# Altium schematic symbol library jlcpcb_2025_04_capacitors_extended_0402.schlib: 3594 symbols (part 4 of 20) (continued)
## 0402X474K100CT
designator C?  Capacitance: 470nF  (hidden comment: *)
Capacitor, Ceramic (MLCC), 470nF, ±10%, 10V, X5R, ±10%, SMD 0402; Manufacturer: Walsin Tech Corp; Manufacturer Part Number: 0402X474K100CT; Package Size: 0402; JLCPCB Basic Part: No; JLCPCB Part Number: C295946; Supplier 1: LCSC; Category: Capacitors - MLCC; Supplier Part Number 1: C295946; Tolerance: ±10%; Voltage Rating: 10V; Temperature Coefficient: X5R; RoHS: Yes; ComponentLink1Description: Datasheet; ComponentLink1URL: https://wmsc.lcsc.com/wmsc/upload/file/pdf/v2/lcsc/2304140030_Walsin-Tech-Corp-0402X474K100CT_C295946.pdf; ComponentLink2Description: JLCPCB Part URL; ComponentLink2URL: https://jlcpcb.com/partdetail/C295946; ComponentLink3Description: LCSC Part URL; ComponentLink3URL: https://lcsc.com/product-detail/Multilayer-Ceramic-Capacitors-MLCC---SMD-SMT_Walsin-Tech-Corp-Walsin-Tech-Corp-0402X474K100CT_C295946.html
footprint CAP-0402 (0402 (1005M) Capacitor)
pins: 1, 2

## 0402X474K100NT
designator C?  Capacitance: 470000pF  (hidden comment: *)
Capacitor, Ceramic (MLCC), 470000pF, ±10%, 10V, X5R, ±10%, SMD 0402; Manufacturer: FH (Guangdong Fenghua Advanced Tech); Manufacturer Part Number: 0402X474K100NT; Package Size: 0402; JLCPCB Basic Part: No; JLCPCB Part Number: C967572; Supplier 1: LCSC; Category: Capacitors - MLCC; Supplier Part Number 1: C967572; Tolerance: ±10%; Voltage Rating: 10V; Temperature Coefficient: X5R; RoHS: Yes; ComponentLink1Description: Datasheet; ComponentLink1URL: https://wmsc.lcsc.com/wmsc/upload/file/pdf/v2/lcsc/2304140030_FH--Guangdong-Fenghua-Advanced-Tech-0402X474K100NT_C967572.pdf; ComponentLink2Description: JLCPCB Part URL; ComponentLink2URL: https://jlcpcb.com/partdetail/C967572; ComponentLink3Description: LCSC Part URL; ComponentLink3URL: https://lcsc.com/product-detail/Multilayer-Ceramic-Capacitors-MLCC---SMD-SMT_FH-Guangdong-Fenghua-Advanced-Tech-FH-Guangdong-Fenghua-Advanced-Tech-0402X474K100NT_C967572.html
footprint CAP-0402 (0402 (1005M) Capacitor)
pins: 1, 2

## 0402X474K160CT
designator C?  Capacitance: 470nF  (hidden comment: *)
Capacitor, Ceramic (MLCC), 470nF, ±10%, 16V, X5R, ±10%, SMD 0402; Manufacturer: Walsin Tech Corp; Manufacturer Part Number: 0402X474K160CT; Package Size: 0402; JLCPCB Basic Part: No; JLCPCB Part Number: C575468; Supplier 1: LCSC; Category: Capacitors - MLCC; Supplier Part Number 1: C575468; Tolerance: ±10%; Voltage Rating: 16V; Temperature Coefficient: X5R; RoHS: Yes; ComponentLink1Description: Datasheet; ComponentLink1URL: https://wmsc.lcsc.com/wmsc/upload/file/pdf/v2/lcsc/2304140030_Walsin-Tech-Corp-0402X474K160CT_C575468.pdf; ComponentLink2Description: JLCPCB Part URL; ComponentLink2URL: https://jlcpcb.com/partdetail/C575468; ComponentLink3Description: LCSC Part URL; ComponentLink3URL: https://lcsc.com/product-detail/Multilayer-Ceramic-Capacitors-MLCC---SMD-SMT_Walsin-Tech-Corp-Walsin-Tech-Corp-0402X474K160CT_C575468.html
footprint CAP-0402 (0402 (1005M) Capacitor)
pins: 1, 2

## 0402X474K250CT
designator C?  Capacitance: 470nF  (hidden comment: *)
Capacitor, Ceramic (MLCC), 470nF, ±10%, 25V, X5R, ±10%, SMD 0402; Manufacturer: Walsin Tech Corp; Manufacturer Part Number: 0402X474K250CT; Package Size: 0402; JLCPCB Basic Part: No; JLCPCB Part Number: C387962; Supplier 1: LCSC; Category: Capacitors - MLCC; Supplier Part Number 1: C387962; Tolerance: ±10%; Voltage Rating: 25V; Temperature Coefficient: X5R; RoHS: Yes; ComponentLink1Description: Datasheet; ComponentLink1URL: https://wmsc.lcsc.com/wmsc/upload/file/pdf/v2/lcsc/2304140030_Walsin-Tech-Corp-0402X474K250CT_C387962.pdf; ComponentLink2Description: JLCPCB Part URL; ComponentLink2URL: https://jlcpcb.com/partdetail/C387962; ComponentLink3Description: LCSC Part URL; ComponentLink3URL: https://lcsc.com/product-detail/Multilayer-Ceramic-Capacitors-MLCC---SMD-SMT_Walsin-Tech-Corp-Walsin-Tech-Corp-0402X474K250CT_C387962.html
footprint CAP-0402 (0402 (1005M) Capacitor)
pins: 1, 2

## 0402X474K250NT
designator C?  Capacitance: 470nF  (hidden comment: *)
Capacitor, Ceramic (MLCC), 470nF, ±10%, 25V, X5R, ±10%, SMD 0402; Manufacturer: FH (Guangdong Fenghua Advanced Tech); Manufacturer Part Number: 0402X474K250NT; Package Size: 0402; JLCPCB Basic Part: No; JLCPCB Part Number: C2934765; Supplier 1: LCSC; Category: Capacitors - MLCC; Supplier Part Number 1: C2934765; Tolerance: ±10%; Voltage Rating: 25V; Temperature Coefficient: X5R; RoHS: Yes; ComponentLink1Description: Datasheet; ComponentLink1URL: https://wmsc.lcsc.com/wmsc/upload/file/pdf/v2/lcsc/2201121630_FH--Guangdong-Fenghua-Advanced-Tech-0402X474K250NT_C2934765.pdf; ComponentLink2Description: JLCPCB Part URL; ComponentLink2URL: https://jlcpcb.com/partdetail/C2934765; ComponentLink3Description: LCSC Part URL; ComponentLink3URL: https://lcsc.com/product-detail/Multilayer-Ceramic-Capacitors-MLCC---SMD-SMT_FH-Guangdong-Fenghua-Advanced-Tech-FH-Guangdong-Fenghua-Advanced-Tech-0402X474K250NT_C2934765.html
footprint CAP-0402 (0402 (1005M) Capacitor)
pins: 1, 2

## 0402X474K500CT
designator C?  Capacitance: 470nF  (hidden comment: *)
Capacitor, Ceramic (MLCC), 470nF, ±10%, 50V, X5R, ±10%, SMD 0402; Manufacturer: Walsin Tech Corp; Manufacturer Part Number: 0402X474K500CT; Package Size: 0402; JLCPCB Basic Part: No; JLCPCB Part Number: C2443204; Supplier 1: LCSC; Category: Capacitors - MLCC; Supplier Part Number 1: C2443204; Tolerance: ±10%; Voltage Rating: 50V; Temperature Coefficient: X5R; RoHS: Yes; ComponentLink1Description: Datasheet; ComponentLink1URL: https://wmsc.lcsc.com/wmsc/upload/file/pdf/v2/lcsc/2309201534_Walsin-Tech-Corp-0402X474K500CT_C2443204.pdf; ComponentLink2Description: JLCPCB Part URL; ComponentLink2URL: https://jlcpcb.com/partdetail/C2443204; ComponentLink3Description: LCSC Part URL; ComponentLink3URL: https://lcsc.com/product-detail/Multilayer-Ceramic-Capacitors-MLCC---SMD-SMT_Walsin-Tech-Corp-Walsin-Tech-Corp-0402X474K500CT_C2443204.html
footprint CAP-0402 (0402 (1005M) Capacitor)
pins: 1, 2

## 0402X475K6R3NT
designator C?  Capacitance: 4.7uF  (hidden comment: *)
Capacitor, Ceramic (MLCC), 4.7uF, ±10%, 6.3V, X5R, ±10%, SMD 0402; Manufacturer: FH(Guangdong Fenghua Advanced Tech); Manufacturer Part Number: 0402X475K6R3NT; Package Size: 0402; JLCPCB Basic Part: No; JLCPCB Part Number: C157354; Supplier 1: LCSC; Category: Capacitors - MLCC; Supplier Part Number 1: C157354; Tolerance: ±10%; Voltage Rating: 6.3V; Temperature Coefficient: X5R; RoHS: Yes; ComponentLink1Description: Datasheet; ComponentLink1URL: https://wmsc.lcsc.com/wmsc/upload/file/pdf/v2/lcsc/2304140030_FH--Guangdong-Fenghua-Advanced-Tech-0402X475K6R3NT_C157354.pdf; ComponentLink2Description: JLCPCB Part URL; ComponentLink2URL: https://jlcpcb.com/partdetail/C157354; ComponentLink3Description: LCSC Part URL; ComponentLink3URL: https://lcsc.com/product-detail/Multilayer-Ceramic-Capacitors-MLCC---SMD-SMT_FH-Guangdong-Fenghua-Advanced-Tech-FH-Guangdong-Fenghua-Advanced-Tech-0402X475K6R3NT_C157354.html
footprint CAP-0402 (0402 (1005M) Capacitor)
pins: 1, 2

## 0402X475K100NT
designator C?  Capacitance: 4.7uF  (hidden comment: *)
Capacitor, Ceramic (MLCC), 4.7uF, ±10%, 10V, X5R, ±10%, SMD 0402; Manufacturer: FH(Guangdong Fenghua Advanced Tech); Manufacturer Part Number: 0402X475K100NT; Package Size: 0402; JLCPCB Basic Part: No; JLCPCB Part Number: C191541; Supplier 1: LCSC; Category: Capacitors - MLCC; Supplier Part Number 1: C191541; Tolerance: ±10%; Voltage Rating: 10V; Temperature Coefficient: X5R; RoHS: Yes; ComponentLink1Description: Datasheet; ComponentLink1URL: https://wmsc.lcsc.com/wmsc/upload/file/pdf/v2/lcsc/2310131130_FH--Guangdong-Fenghua-Advanced-Tech-0402X475K100NT_C191541.pdf; ComponentLink2Description: JLCPCB Part URL; ComponentLink2URL: https://jlcpcb.com/partdetail/C191541; ComponentLink3Description: LCSC Part URL; ComponentLink3URL: https://lcsc.com/product-detail/Multilayer-Ceramic-Capacitors-MLCC---SMD-SMT_FH-Guangdong-Fenghua-Advanced-Tech-FH-Guangdong-Fenghua-Advanced-Tech-0402X475K100NT_C191541.html
footprint CAP-0402 (0402 (1005M) Capacitor)
pins: 1, 2

## 0402X475M6R3CT
designator C?  Capacitance: 4.7uF  (hidden comment: *)
Capacitor, Ceramic (MLCC), 4.7uF, ±20%, 6.3V, X5R, ±20%, SMD 0402; Manufacturer: Walsin Tech Corp; Manufacturer Part Number: 0402X475M6R3CT; Package Size: 0402; JLCPCB Basic Part: No; JLCPCB Part Number: C340648; Supplier 1: LCSC; Category: Capacitors - MLCC; Supplier Part Number 1: C340648; Tolerance: ±20%; Voltage Rating: 6.3V; Temperature Coefficient: X5R; RoHS: Yes; ComponentLink1Description: Datasheet; ComponentLink1URL: https://wmsc.lcsc.com/wmsc/upload/file/pdf/v2/lcsc/2304140030_Walsin-Tech-Corp-0402X475M6R3CT_C340648.pdf; ComponentLink2Description: JLCPCB Part URL; ComponentLink2URL: https://jlcpcb.com/partdetail/C340648; ComponentLink3Description: LCSC Part URL; ComponentLink3URL: https://lcsc.com/product-detail/Multilayer-Ceramic-Capacitors-MLCC---SMD-SMT_Walsin-Tech-Corp-Walsin-Tech-Corp-0402X475M6R3CT_C340648.html
footprint CAP-0402 (0402 (1005M) Capacitor)
pins: 1, 2

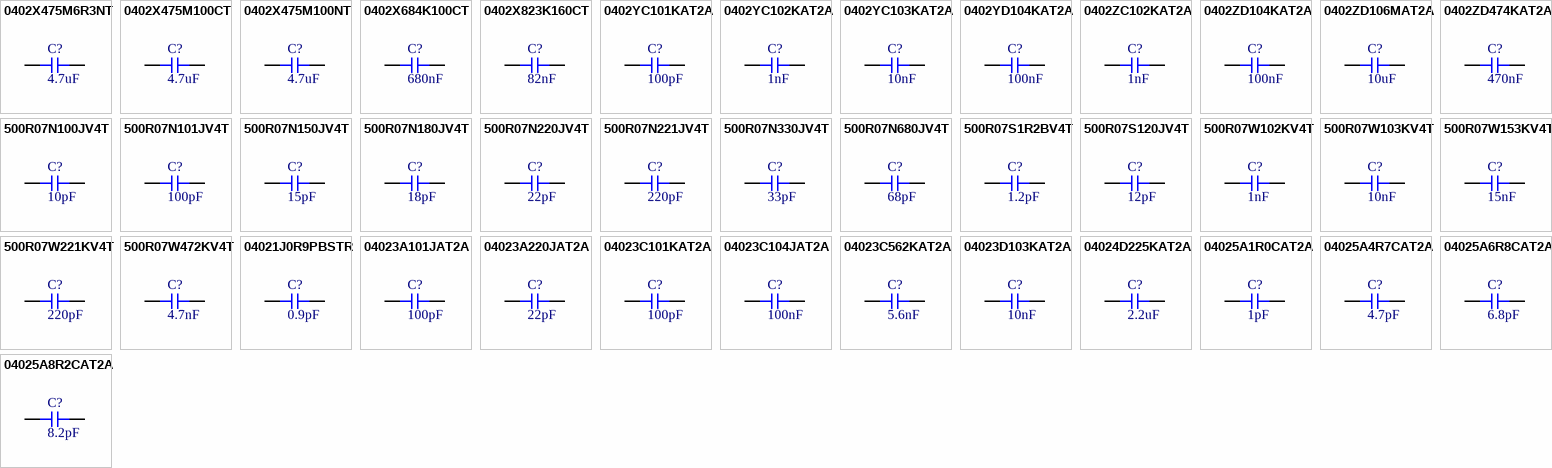
[diagram p15: symbols 0402X475M6R3NT to 04025A8R2CAT2A]

## 0402X475M6R3NT
designator C?  Capacitance: 4.7uF  (hidden comment: *)
Capacitor, Ceramic (MLCC), 4.7uF, ±20%, 6.3V, X5R, ±20%, SMD 0402; Manufacturer: FH(Guangdong Fenghua Advanced Tech); Manufacturer Part Number: 0402X475M6R3NT; Package Size: 0402; JLCPCB Basic Part: No; JLCPCB Part Number: C168172; Supplier 1: LCSC; Category: Capacitors - MLCC; Supplier Part Number 1: C168172; Tolerance: ±20%; Voltage Rating: 6.3V; Temperature Coefficient: X5R; RoHS: Yes; ComponentLink1Description: Datasheet; ComponentLink1URL: https://wmsc.lcsc.com/wmsc/upload/file/pdf/v2/lcsc/2304140030_FH--Guangdong-Fenghua-Advanced-Tech-0402X475M6R3NT_C168172.pdf; ComponentLink2Description: JLCPCB Part URL; ComponentLink2URL: https://jlcpcb.com/partdetail/C168172; ComponentLink3Description: LCSC Part URL; ComponentLink3URL: https://lcsc.com/product-detail/Multilayer-Ceramic-Capacitors-MLCC---SMD-SMT_FH-Guangdong-Fenghua-Advanced-Tech-FH-Guangdong-Fenghua-Advanced-Tech-0402X475M6R3NT_C168172.html
footprint CAP-0402 (0402 (1005M) Capacitor)
pins: 1, 2

## 0402X475M100CT
designator C?  Capacitance: 4.7uF  (hidden comment: *)
Capacitor, Ceramic (MLCC), 4.7uF, 10V, X5R, SMD 0402; Manufacturer: Walsin Tech Corp; Manufacturer Part Number: 0402X475M100CT; Package Size: 0402; JLCPCB Basic Part: No; JLCPCB Part Number: C2909465; Supplier 1: LCSC; Category: Capacitors - MLCC; Supplier Part Number 1: C2909465; Voltage Rating: 10V; Temperature Coefficient: X5R; RoHS: Yes; ComponentLink1Description: Datasheet; ComponentLink1URL: https://wmsc.lcsc.com/wmsc/upload/file/pdf/v2/lcsc/2110272130_Walsin-Tech-Corp-0402X475M100CT_C2909465.pdf; ComponentLink2Description: JLCPCB Part URL; ComponentLink2URL: https://jlcpcb.com/partdetail/C2909465; ComponentLink3Description: LCSC Part URL; ComponentLink3URL: https://lcsc.com/product-detail/Multilayer-Ceramic-Capacitors-MLCC---SMD-SMT_Walsin-Tech-Corp-Walsin-Tech-Corp-0402X475M100CT_C2909465.html
footprint CAP-0402 (0402 (1005M) Capacitor)
pins: 1, 2

## 0402X475M100NT
designator C?  Capacitance: 4.7uF  (hidden comment: *)
Capacitor, Ceramic (MLCC), 4.7uF, ±20%, 10V, X5R, ±20%, SMD 0402; Manufacturer: FH(Guangdong Fenghua Advanced Tech); Manufacturer Part Number: 0402X475M100NT; Package Size: 0402; JLCPCB Basic Part: No; JLCPCB Part Number: C167656; Supplier 1: LCSC; Category: Capacitors - MLCC; Supplier Part Number 1: C167656; Tolerance: ±20%; Voltage Rating: 10V; Temperature Coefficient: X5R; RoHS: Yes; ComponentLink1Description: Datasheet; ComponentLink1URL: https://wmsc.lcsc.com/wmsc/upload/file/pdf/v2/lcsc/2304140030_FH--Guangdong-Fenghua-Advanced-Tech-0402X475M100NT_C167656.pdf; ComponentLink2Description: JLCPCB Part URL; ComponentLink2URL: https://jlcpcb.com/partdetail/C167656; ComponentLink3Description: LCSC Part URL; ComponentLink3URL: https://lcsc.com/product-detail/Multilayer-Ceramic-Capacitors-MLCC---SMD-SMT_FH-Guangdong-Fenghua-Advanced-Tech-FH-Guangdong-Fenghua-Advanced-Tech-0402X475M100NT_C167656.html
footprint CAP-0402 (0402 (1005M) Capacitor)
pins: 1, 2

## 0402X684K100CT
designator C?  Capacitance: 680nF  (hidden comment: *)
Capacitor, Ceramic (MLCC), 680nF, ±10%, 10V, X5R, ±10%, SMD 0402; Manufacturer: Walsin Tech Corp; Manufacturer Part Number: 0402X684K100CT; Package Size: 0402; JLCPCB Basic Part: No; JLCPCB Part Number: C295947; Supplier 1: LCSC; Category: Capacitors - MLCC; Supplier Part Number 1: C295947; Tolerance: ±10%; Voltage Rating: 10V; Temperature Coefficient: X5R; RoHS: Yes; ComponentLink1Description: Datasheet; ComponentLink1URL: https://wmsc.lcsc.com/wmsc/upload/file/pdf/v2/lcsc/2304140030_Walsin-Tech-Corp-0402X684K100CT_C295947.pdf; ComponentLink2Description: JLCPCB Part URL; ComponentLink2URL: https://jlcpcb.com/partdetail/C295947; ComponentLink3Description: LCSC Part URL; ComponentLink3URL: https://lcsc.com/product-detail/Multilayer-Ceramic-Capacitors-MLCC---SMD-SMT_Walsin-Tech-Corp-Walsin-Tech-Corp-0402X684K100CT_C295947.html
footprint CAP-0402 (0402 (1005M) Capacitor)
pins: 1, 2

## 0402X823K160CT
designator C?  Capacitance: 82nF  (hidden comment: *)
Capacitor, Ceramic (MLCC), 82nF, ±10%, 16V, X5R, ±10%, SMD 0402; Manufacturer: Walsin Tech Corp; Manufacturer Part Number: 0402X823K160CT; Package Size: 0402; JLCPCB Basic Part: No; JLCPCB Part Number: C458873; Supplier 1: LCSC; Category: Capacitors - MLCC; Supplier Part Number 1: C458873; Tolerance: ±10%; Voltage Rating: 16V; Temperature Coefficient: X5R; RoHS: Yes; ComponentLink1Description: Datasheet; ComponentLink1URL: https://wmsc.lcsc.com/wmsc/upload/file/pdf/v2/lcsc/2304140030_Walsin-Tech-Corp-0402X823K160CT_C458873.pdf; ComponentLink2Description: JLCPCB Part URL; ComponentLink2URL: https://jlcpcb.com/partdetail/C458873; ComponentLink3Description: LCSC Part URL; ComponentLink3URL: https://lcsc.com/product-detail/Multilayer-Ceramic-Capacitors-MLCC---SMD-SMT_Walsin-Tech-Corp-Walsin-Tech-Corp-0402X823K160CT_C458873.html
footprint CAP-0402 (0402 (1005M) Capacitor)
pins: 1, 2

## 0402YC101KAT2A
designator C?  Capacitance: 100pF  (hidden comment: *)
Capacitor, Ceramic (MLCC), 100pF, ±10%, 16V, X7R, ±10%, SMD 0402; Manufacturer: AVX; Manufacturer Part Number: 0402YC101KAT2A; Package Size: 0402; JLCPCB Basic Part: No; JLCPCB Part Number: C597051; Supplier 1: LCSC; Category: Capacitors - MLCC; Supplier Part Number 1: C597051; Tolerance: ±10%; Voltage Rating: 16V; Temperature Coefficient: X7R; RoHS: Yes; ComponentLink1Description: Datasheet; ComponentLink1URL: https://wmsc.lcsc.com/wmsc/upload/file/pdf/v2/lcsc/2304140030_Kyocera-AVX-0402YC101KAT2A_C597051.pdf; ComponentLink2Description: JLCPCB Part URL; ComponentLink2URL: https://jlcpcb.com/partdetail/C597051; ComponentLink3Description: LCSC Part URL; ComponentLink3URL: https://lcsc.com/product-detail/Multilayer-Ceramic-Capacitors-MLCC---SMD-SMT_Kyocera-AVX-Kyocera-AVX-0402YC101KAT2A_C597051.html
footprint CAP-0402 (0402 (1005M) Capacitor)
pins: 1, 2

## 0402YC102KAT2A
designator C?  Capacitance: 1nF  (hidden comment: *)
Capacitor, Ceramic (MLCC), 1nF, ±10%, 16V, X7R, ±10%, SMD 0402; Manufacturer: AVX; Manufacturer Part Number: 0402YC102KAT2A; Package Size: 0402; JLCPCB Basic Part: No; JLCPCB Part Number: C597052; Supplier 1: LCSC; Category: Capacitors - MLCC; Supplier Part Number 1: C597052; Tolerance: ±10%; Voltage Rating: 16V; Temperature Coefficient: X7R; RoHS: Yes; ComponentLink1Description: Datasheet; ComponentLink1URL: https://wmsc.lcsc.com/wmsc/upload/file/pdf/v2/lcsc/2304140030_Kyocera-AVX-0402YC102KAT2A_C597052.pdf; ComponentLink2Description: JLCPCB Part URL; ComponentLink2URL: https://jlcpcb.com/partdetail/C597052; ComponentLink3Description: LCSC Part URL; ComponentLink3URL: https://lcsc.com/product-detail/Multilayer-Ceramic-Capacitors-MLCC---SMD-SMT_Kyocera-AVX-Kyocera-AVX-0402YC102KAT2A_C597052.html
footprint CAP-0402 (0402 (1005M) Capacitor)
pins: 1, 2

## 0402YC103KAT2A
designator C?  Capacitance: 10nF  (hidden comment: *)
Capacitor, Ceramic (MLCC), 10nF, ±10%, 16V, X7R, ±10%, SMD 0402; Manufacturer: AVX; Manufacturer Part Number: 0402YC103KAT2A; Package Size: 0402; JLCPCB Basic Part: No; JLCPCB Part Number: C597054; Supplier 1: LCSC; Category: Capacitors - MLCC; Supplier Part Number 1: C597054; Tolerance: ±10%; Voltage Rating: 16V; Temperature Coefficient: X7R; RoHS: Yes; ComponentLink1Description: Datasheet; ComponentLink1URL: https://wmsc.lcsc.com/wmsc/upload/file/pdf/v2/lcsc/2304140030_Kyocera-AVX-0402YC103KAT2A_C597054.pdf; ComponentLink2Description: JLCPCB Part URL; ComponentLink2URL: https://jlcpcb.com/partdetail/C597054; ComponentLink3Description: LCSC Part URL; ComponentLink3URL: https://lcsc.com/product-detail/Multilayer-Ceramic-Capacitors-MLCC---SMD-SMT_Kyocera-AVX-Kyocera-AVX-0402YC103KAT2A_C597054.html
footprint CAP-0402 (0402 (1005M) Capacitor)
pins: 1, 2

## 0402YD104KAT2A
designator C?  Capacitance: 100nF  (hidden comment: *)
Capacitor, Ceramic (MLCC), 100nF, ±10%, 16V, X5R, ±10%, SMD 0402; Manufacturer: AVX; Manufacturer Part Number: 0402YD104KAT2A; Package Size: 0402; JLCPCB Basic Part: No; JLCPCB Part Number: C142647; Supplier 1: LCSC; Category: Capacitors - MLCC; Supplier Part Number 1: C142647; Tolerance: ±10%; Voltage Rating: 16V; Temperature Coefficient: X5R; RoHS: Yes; ComponentLink1Description: Datasheet; ComponentLink1URL: https://wmsc.lcsc.com/wmsc/upload/file/pdf/v2/lcsc/2304140030_Kyocera-AVX-0402YD104KAT2A_C142647.pdf; ComponentLink2Description: JLCPCB Part URL; ComponentLink2URL: https://jlcpcb.com/partdetail/C142647; ComponentLink3Description: LCSC Part URL; ComponentLink3URL: https://lcsc.com/product-detail/Multilayer-Ceramic-Capacitors-MLCC---SMD-SMT_Kyocera-AVX-Kyocera-AVX-0402YD104KAT2A_C142647.html
footprint CAP-0402 (0402 (1005M) Capacitor)
pins: 1, 2

## 0402ZC102KAT2A
designator C?  Capacitance: 1nF  (hidden comment: *)
Capacitor, Ceramic (MLCC), 1nF, ±10%, 10V, X7R, ±10%, SMD 0402; Manufacturer: Kyocera AVX; Manufacturer Part Number: 0402ZC102KAT2A; Package Size: 0402; JLCPCB Basic Part: No; JLCPCB Part Number: C5348662; Supplier 1: LCSC; Category: Capacitors - MLCC; Supplier Part Number 1: C5348662; Tolerance: ±10%; Voltage Rating: 10V; Temperature Coefficient: X7R; RoHS: Yes; ComponentLink1Description: Datasheet; ComponentLink1URL: https://wmsc.lcsc.com/wmsc/upload/file/pdf/v2/lcsc/2302011230_Kyocera-AVX-0402ZC102KAT2A_C5348662.pdf; ComponentLink2Description: JLCPCB Part URL; ComponentLink2URL: https://jlcpcb.com/partdetail/C5348662; ComponentLink3Description: LCSC Part URL; ComponentLink3URL: https://lcsc.com/product-detail/Multilayer-Ceramic-Capacitors-MLCC---SMD-SMT_Kyocera-AVX-Kyocera-AVX-0402ZC102KAT2A_C5348662.html
footprint CAP-0402 (0402 (1005M) Capacitor)
pins: 1, 2

## 0402ZD104KAT2A
designator C?  Capacitance: 100nF  (hidden comment: *)
Capacitor, Ceramic (MLCC), 100nF, ±10%, 10V, X5R, ±10%, SMD 0402; Manufacturer: Kyocera AVX; Manufacturer Part Number: 0402ZD104KAT2A; Package Size: 0402; JLCPCB Basic Part: No; JLCPCB Part Number: C2649532; Supplier 1: LCSC; Category: Capacitors - MLCC; Supplier Part Number 1: C2649532; Tolerance: ±10%; Voltage Rating: 10V; Temperature Coefficient: X5R; RoHS: Yes; ComponentLink1Description: Datasheet; ComponentLink1URL: https://wmsc.lcsc.com/wmsc/upload/file/pdf/v2/lcsc/2304140030_Kyocera-AVX-0402ZD104KAT2A_C2649532.pdf; ComponentLink2Description: JLCPCB Part URL; ComponentLink2URL: https://jlcpcb.com/partdetail/C2649532; ComponentLink3Description: LCSC Part URL; ComponentLink3URL: https://lcsc.com/product-detail/Multilayer-Ceramic-Capacitors-MLCC---SMD-SMT_Kyocera-AVX-Kyocera-AVX-0402ZD104KAT2A_C2649532.html
footprint CAP-0402 (0402 (1005M) Capacitor)
pins: 1, 2

## 0402ZD106MAT2A
designator C?  Capacitance: 10uF  (hidden comment: *)
Capacitor, Ceramic (MLCC), 10uF, ±20%, 10V, X5R, ±20%, SMD 0402; Manufacturer: Kyocera AVX; Manufacturer Part Number: 0402ZD106MAT2A; Package Size: 0402; JLCPCB Basic Part: No; JLCPCB Part Number: C2167902; Supplier 1: LCSC; Category: Capacitors - MLCC; Supplier Part Number 1: C2167902; Tolerance: ±20%; Voltage Rating: 10V; Temperature Coefficient: X5R; RoHS: Yes; ComponentLink1Description: Datasheet; ComponentLink1URL: https://wmsc.lcsc.com/wmsc/upload/file/pdf/v2/lcsc/2304140030_Kyocera-AVX-0402ZD106MAT2A_C2167902.pdf; ComponentLink2Description: JLCPCB Part URL; ComponentLink2URL: https://jlcpcb.com/partdetail/C2167902; ComponentLink3Description: LCSC Part URL; ComponentLink3URL: https://lcsc.com/product-detail/Multilayer-Ceramic-Capacitors-MLCC---SMD-SMT_Kyocera-AVX-Kyocera-AVX-0402ZD106MAT2A_C2167902.html
footprint CAP-0402 (0402 (1005M) Capacitor)
pins: 1, 2

## 0402ZD474KAT2A
designator C?  Capacitance: 470nF  (hidden comment: *)
Capacitor, Ceramic (MLCC), 470nF, ±10%, 10V, X5R, ±10%, SMD 0402; Manufacturer: AVX; Manufacturer Part Number: 0402ZD474KAT2A; Package Size: 0402; JLCPCB Basic Part: No; JLCPCB Part Number: C597063; Supplier 1: LCSC; Category: Capacitors - MLCC; Supplier Part Number 1: C597063; Tolerance: ±10%; Voltage Rating: 10V; Temperature Coefficient: X5R; RoHS: Yes; ComponentLink1Description: Datasheet; ComponentLink1URL: https://wmsc.lcsc.com/wmsc/upload/file/pdf/v2/lcsc/2304140030_Kyocera-AVX-0402ZD474KAT2A_C597063.pdf; ComponentLink2Description: JLCPCB Part URL; ComponentLink2URL: https://jlcpcb.com/partdetail/C597063; ComponentLink3Description: LCSC Part URL; ComponentLink3URL: https://lcsc.com/product-detail/Multilayer-Ceramic-Capacitors-MLCC---SMD-SMT_Kyocera-AVX-Kyocera-AVX-0402ZD474KAT2A_C597063.html
footprint CAP-0402 (0402 (1005M) Capacitor)
pins: 1, 2

## 500R07N100JV4T
designator C?  Capacitance: 10pF  (hidden comment: *)
Capacitor, Ceramic (MLCC), 10pF, ±5%, 50V, NP0, ±5%, SMD 0402; Manufacturer: Johanson Dielectrics; Manufacturer Part Number: 500R07N100JV4T; Package Size: 0402; JLCPCB Basic Part: No; JLCPCB Part Number: C431653; Supplier 1: LCSC; Category: Capacitors - MLCC; Supplier Part Number 1: C431653; Tolerance: ±5%; Voltage Rating: 50V; Temperature Coefficient: NP0; RoHS: Yes; ComponentLink1Description: Datasheet; ComponentLink1URL: https://wmsc.lcsc.com/wmsc/upload/file/pdf/v2/lcsc/2304140030_Johanson-Dielectrics-500R07N100JV4T_C431653.pdf; ComponentLink2Description: JLCPCB Part URL; ComponentLink2URL: https://jlcpcb.com/partdetail/C431653; ComponentLink3Description: LCSC Part URL; ComponentLink3URL: https://lcsc.com/product-detail/Multilayer-Ceramic-Capacitors-MLCC---SMD-SMT_Johanson-Dielectrics-Johanson-Dielectrics-500R07N100JV4T_C431653.html
footprint CAP-0402 (0402 (1005M) Capacitor)
pins: 1, 2

## 500R07N101JV4T
designator C?  Capacitance: 100pF  (hidden comment: *)
Capacitor, Ceramic (MLCC), 100pF, ±5%, 50V, NP0, ±5%, SMD 0402; Manufacturer: Johanson Dielectrics; Manufacturer Part Number: 500R07N101JV4T; Package Size: 0402; JLCPCB Basic Part: No; JLCPCB Part Number: C431654; Supplier 1: LCSC; Category: Capacitors - MLCC; Supplier Part Number 1: C431654; Tolerance: ±5%; Voltage Rating: 50V; Temperature Coefficient: NP0; RoHS: Yes; ComponentLink1Description: Datasheet; ComponentLink1URL: https://wmsc.lcsc.com/wmsc/upload/file/pdf/v2/lcsc/2304140030_Johanson-Dielectrics-500R07N101JV4T_C431654.pdf; ComponentLink2Description: JLCPCB Part URL; ComponentLink2URL: https://jlcpcb.com/partdetail/C431654; ComponentLink3Description: LCSC Part URL; ComponentLink3URL: https://lcsc.com/product-detail/Multilayer-Ceramic-Capacitors-MLCC---SMD-SMT_Johanson-Dielectrics-Johanson-Dielectrics-500R07N101JV4T_C431654.html
footprint CAP-0402 (0402 (1005M) Capacitor)
pins: 1, 2

## 500R07N150JV4T
designator C?  Capacitance: 15pF  (hidden comment: *)
Capacitor, Ceramic (MLCC), 15pF, ±5%, 50V, NP0, ±5%, SMD 0402; Manufacturer: Johanson Dielectrics; Manufacturer Part Number: 500R07N150JV4T; Package Size: 0402; JLCPCB Basic Part: No; JLCPCB Part Number: C431655; Supplier 1: LCSC; Category: Capacitors - MLCC; Supplier Part Number 1: C431655; Tolerance: ±5%; Voltage Rating: 50V; Temperature Coefficient: NP0; RoHS: Yes; ComponentLink1Description: Datasheet; ComponentLink1URL: https://wmsc.lcsc.com/wmsc/upload/file/pdf/v2/lcsc/2304140030_Johanson-Dielectrics-500R07N150JV4T_C431655.pdf; ComponentLink2Description: JLCPCB Part URL; ComponentLink2URL: https://jlcpcb.com/partdetail/C431655; ComponentLink3Description: LCSC Part URL; ComponentLink3URL: https://lcsc.com/product-detail/Multilayer-Ceramic-Capacitors-MLCC---SMD-SMT_Johanson-Dielectrics-Johanson-Dielectrics-500R07N150JV4T_C431655.html
footprint CAP-0402 (0402 (1005M) Capacitor)
pins: 1, 2

## 500R07N180JV4T
designator C?  Capacitance: 18pF  (hidden comment: *)
Capacitor, Ceramic (MLCC), 18pF, ±5%, 50V, NP0, ±5%, SMD 0402; Manufacturer: Johanson Dielectrics; Manufacturer Part Number: 500R07N180JV4T; Package Size: 0402; JLCPCB Basic Part: No; JLCPCB Part Number: C431656; Supplier 1: LCSC; Category: Capacitors - MLCC; Supplier Part Number 1: C431656; Tolerance: ±5%; Voltage Rating: 50V; Temperature Coefficient: NP0; RoHS: Yes; ComponentLink1Description: Datasheet; ComponentLink1URL: https://wmsc.lcsc.com/wmsc/upload/file/pdf/v2/lcsc/2304140030_Johanson-Dielectrics-500R07N180JV4T_C431656.pdf; ComponentLink2Description: JLCPCB Part URL; ComponentLink2URL: https://jlcpcb.com/partdetail/C431656; ComponentLink3Description: LCSC Part URL; ComponentLink3URL: https://lcsc.com/product-detail/Multilayer-Ceramic-Capacitors-MLCC---SMD-SMT_Johanson-Dielectrics-Johanson-Dielectrics-500R07N180JV4T_C431656.html
footprint CAP-0402 (0402 (1005M) Capacitor)
pins: 1, 2

## 500R07N220JV4T
designator C?  Capacitance: 22pF  (hidden comment: *)
Capacitor, Ceramic (MLCC), 22pF, ±5%, 50V, NP0, ±5%, SMD 0402; Manufacturer: Johanson Dielectrics; Manufacturer Part Number: 500R07N220JV4T; Package Size: 0402; JLCPCB Basic Part: No; JLCPCB Part Number: C431657; Supplier 1: LCSC; Category: Capacitors - MLCC; Supplier Part Number 1: C431657; Tolerance: ±5%; Voltage Rating: 50V; Temperature Coefficient: NP0; RoHS: Yes; ComponentLink1Description: Datasheet; ComponentLink1URL: https://wmsc.lcsc.com/wmsc/upload/file/pdf/v2/lcsc/2304140030_Johanson-Dielectrics-500R07N220JV4T_C431657.pdf; ComponentLink2Description: JLCPCB Part URL; ComponentLink2URL: https://jlcpcb.com/partdetail/C431657; ComponentLink3Description: LCSC Part URL; ComponentLink3URL: https://lcsc.com/product-detail/Multilayer-Ceramic-Capacitors-MLCC---SMD-SMT_Johanson-Dielectrics-Johanson-Dielectrics-500R07N220JV4T_C431657.html
footprint CAP-0402 (0402 (1005M) Capacitor)
pins: 1, 2

## 500R07N221JV4T
designator C?  Capacitance: 220pF  (hidden comment: *)
Capacitor, Ceramic (MLCC), 220pF, ±5%, 50V, NP0, ±5%, SMD 0402; Manufacturer: Johanson Dielectrics; Manufacturer Part Number: 500R07N221JV4T; Package Size: 0402; JLCPCB Basic Part: No; JLCPCB Part Number: C431658; Supplier 1: LCSC; Category: Capacitors - MLCC; Supplier Part Number 1: C431658; Tolerance: ±5%; Voltage Rating: 50V; Temperature Coefficient: NP0; RoHS: Yes; ComponentLink1Description: Datasheet; ComponentLink1URL: https://wmsc.lcsc.com/wmsc/upload/file/pdf/v2/lcsc/2304140030_Johanson-Dielectrics-500R07N221JV4T_C431658.pdf; ComponentLink2Description: JLCPCB Part URL; ComponentLink2URL: https://jlcpcb.com/partdetail/C431658; ComponentLink3Description: LCSC Part URL; ComponentLink3URL: https://lcsc.com/product-detail/Multilayer-Ceramic-Capacitors-MLCC---SMD-SMT_Johanson-Dielectrics-Johanson-Dielectrics-500R07N221JV4T_C431658.html
footprint CAP-0402 (0402 (1005M) Capacitor)
pins: 1, 2

## 500R07N330JV4T
designator C?  Capacitance: 33pF  (hidden comment: *)
Capacitor, Ceramic (MLCC), 33pF, ±5%, 50V, NP0, ±5%, SMD 0402; Manufacturer: Johanson Dielectrics; Manufacturer Part Number: 500R07N330JV4T; Package Size: 0402; JLCPCB Basic Part: No; JLCPCB Part Number: C431659; Supplier 1: LCSC; Category: Capacitors - MLCC; Supplier Part Number 1: C431659; Tolerance: ±5%; Voltage Rating: 50V; Temperature Coefficient: NP0; RoHS: Yes; ComponentLink1Description: Datasheet; ComponentLink1URL: https://wmsc.lcsc.com/wmsc/upload/file/pdf/v2/lcsc/2304140030_Johanson-Dielectrics-500R07N330JV4T_C431659.pdf; ComponentLink2Description: JLCPCB Part URL; ComponentLink2URL: https://jlcpcb.com/partdetail/C431659; ComponentLink3Description: LCSC Part URL; ComponentLink3URL: https://lcsc.com/product-detail/Multilayer-Ceramic-Capacitors-MLCC---SMD-SMT_Johanson-Dielectrics-Johanson-Dielectrics-500R07N330JV4T_C431659.html
footprint CAP-0402 (0402 (1005M) Capacitor)
pins: 1, 2

## 500R07N680JV4T
designator C?  Capacitance: 68pF  (hidden comment: *)
Capacitor, Ceramic (MLCC), 68pF, ±5%, 50V, NP0, ±5%, SMD 0402; Manufacturer: Johanson Dielectrics; Manufacturer Part Number: 500R07N680JV4T; Package Size: 0402; JLCPCB Basic Part: No; JLCPCB Part Number: C431643; Supplier 1: LCSC; Category: Capacitors - MLCC; Supplier Part Number 1: C431643; Tolerance: ±5%; Voltage Rating: 50V; Temperature Coefficient: NP0; RoHS: Yes; ComponentLink1Description: Datasheet; ComponentLink1URL: https://wmsc.lcsc.com/wmsc/upload/file/pdf/v2/lcsc/2304140030_Johanson-Dielectrics-500R07N680JV4T_C431643.pdf; ComponentLink2Description: JLCPCB Part URL; ComponentLink2URL: https://jlcpcb.com/partdetail/C431643; ComponentLink3Description: LCSC Part URL; ComponentLink3URL: https://lcsc.com/product-detail/Multilayer-Ceramic-Capacitors-MLCC---SMD-SMT_Johanson-Dielectrics-Johanson-Dielectrics-500R07N680JV4T_C431643.html
footprint CAP-0402 (0402 (1005M) Capacitor)
pins: 1, 2

## 500R07S1R2BV4T
designator C?  Capacitance: 1.2pF  (hidden comment: *)
Capacitor, Ceramic (MLCC), 1.2pF, 50V, NP0, SMD 0402; Manufacturer: Johanson Dielectrics; Manufacturer Part Number: 500R07S1R2BV4T; Package Size: 0402; JLCPCB Basic Part: No; JLCPCB Part Number: C2167132; Supplier 1: LCSC; Category: Capacitors - MLCC; Supplier Part Number 1: C2167132; Voltage Rating: 50V; Temperature Coefficient: NP0; RoHS: Yes; ComponentLink1Description: Datasheet; ComponentLink1URL: https://wmsc.lcsc.com/wmsc/upload/file/pdf/v2/lcsc/2304140030_Johanson-Dielectrics-500R07S1R2BV4T_C2167132.pdf; ComponentLink2Description: JLCPCB Part URL; ComponentLink2URL: https://jlcpcb.com/partdetail/C2167132; ComponentLink3Description: LCSC Part URL; ComponentLink3URL: https://lcsc.com/product-detail/Multilayer-Ceramic-Capacitors-MLCC---SMD-SMT_Johanson-Dielectrics-Johanson-Dielectrics-500R07S1R2BV4T_C2167132.html
footprint CAP-0402 (0402 (1005M) Capacitor)
pins: 1, 2

## 500R07S120JV4T
designator C?  Capacitance: 12pF  (hidden comment: *)
Capacitor, Ceramic (MLCC), 12pF, ±5%, 50V, NP0, ±5%, SMD 0402; Manufacturer: Johanson Dielectrics; Manufacturer Part Number: 500R07S120JV4T; Package Size: 0402; JLCPCB Basic Part: No; JLCPCB Part Number: C2917740; Supplier 1: LCSC; Category: Capacitors - MLCC; Supplier Part Number 1: C2917740; Tolerance: ±5%; Voltage Rating: 50V; Temperature Coefficient: NP0; RoHS: Yes; ComponentLink1Description: Datasheet; ComponentLink1URL: https://wmsc.lcsc.com/wmsc/upload/file/pdf/v2/lcsc/2203311630_Johanson-Dielectrics-500R07S120JV4T_C2917740.pdf; ComponentLink2Description: JLCPCB Part URL; ComponentLink2URL: https://jlcpcb.com/partdetail/C2917740; ComponentLink3Description: LCSC Part URL; ComponentLink3URL: https://lcsc.com/product-detail/Multilayer-Ceramic-Capacitors-MLCC---SMD-SMT_Johanson-Dielectrics-Johanson-Dielectrics-500R07S120JV4T_C2917740.html
footprint CAP-0402 (0402 (1005M) Capacitor)
pins: 1, 2

## 500R07W102KV4T
designator C?  Capacitance: 1nF  (hidden comment: *)
Capacitor, Ceramic (MLCC), 1nF, ±10%, 50V, X7R, ±10%, SMD 0402; Manufacturer: Johanson Dielectrics; Manufacturer Part Number: 500R07W102KV4T; Package Size: 0402; JLCPCB Basic Part: No; JLCPCB Part Number: C431644; Supplier 1: LCSC; Category: Capacitors - MLCC; Supplier Part Number 1: C431644; Tolerance: ±10%; Voltage Rating: 50V; Temperature Coefficient: X7R; RoHS: Yes; ComponentLink1Description: Datasheet; ComponentLink1URL: https://wmsc.lcsc.com/wmsc/upload/file/pdf/v2/lcsc/2304140030_Johanson-Dielectrics-500R07W102KV4T_C431644.pdf; ComponentLink2Description: JLCPCB Part URL; ComponentLink2URL: https://jlcpcb.com/partdetail/C431644; ComponentLink3Description: LCSC Part URL; ComponentLink3URL: https://lcsc.com/product-detail/Multilayer-Ceramic-Capacitors-MLCC---SMD-SMT_Johanson-Dielectrics-Johanson-Dielectrics-500R07W102KV4T_C431644.html
footprint CAP-0402 (0402 (1005M) Capacitor)
pins: 1, 2

## 500R07W103KV4T
designator C?  Capacitance: 10nF  (hidden comment: *)
Capacitor, Ceramic (MLCC), 10nF, ±10%, 50V, X7R, ±10%, SMD 0402; Manufacturer: Johanson Dielectrics; Manufacturer Part Number: 500R07W103KV4T; Package Size: 0402; JLCPCB Basic Part: No; JLCPCB Part Number: C431645; Supplier 1: LCSC; Category: Capacitors - MLCC; Supplier Part Number 1: C431645; Tolerance: ±10%; Voltage Rating: 50V; Temperature Coefficient: X7R; RoHS: Yes; ComponentLink1Description: Datasheet; ComponentLink1URL: https://wmsc.lcsc.com/wmsc/upload/file/pdf/v2/lcsc/2304140030_Johanson-Dielectrics-500R07W103KV4T_C431645.pdf; ComponentLink2Description: JLCPCB Part URL; ComponentLink2URL: https://jlcpcb.com/partdetail/C431645; ComponentLink3Description: LCSC Part URL; ComponentLink3URL: https://lcsc.com/product-detail/Multilayer-Ceramic-Capacitors-MLCC---SMD-SMT_Johanson-Dielectrics-Johanson-Dielectrics-500R07W103KV4T_C431645.html
footprint CAP-0402 (0402 (1005M) Capacitor)
pins: 1, 2

## 500R07W153KV4T
designator C?  Capacitance: 15nF  (hidden comment: *)
Capacitor, Ceramic (MLCC), 15nF, ±10%, 50V, X7R, ±10%, SMD 0402; Manufacturer: Johanson Dielectrics; Manufacturer Part Number: 500R07W153KV4T; Package Size: 0402; JLCPCB Basic Part: No; JLCPCB Part Number: C431647; Supplier 1: LCSC; Category: Capacitors - MLCC; Supplier Part Number 1: C431647; Tolerance: ±10%; Voltage Rating: 50V; Temperature Coefficient: X7R; RoHS: Yes; ComponentLink1Description: Datasheet; ComponentLink1URL: https://wmsc.lcsc.com/wmsc/upload/file/pdf/v2/lcsc/2304140030_Johanson-Dielectrics-500R07W153KV4T_C431647.pdf; ComponentLink2Description: JLCPCB Part URL; ComponentLink2URL: https://jlcpcb.com/partdetail/C431647; ComponentLink3Description: LCSC Part URL; ComponentLink3URL: https://lcsc.com/product-detail/Multilayer-Ceramic-Capacitors-MLCC---SMD-SMT_Johanson-Dielectrics-Johanson-Dielectrics-500R07W153KV4T_C431647.html
footprint CAP-0402 (0402 (1005M) Capacitor)
pins: 1, 2

## 500R07W221KV4T
designator C?  Capacitance: 220pF  (hidden comment: *)
Capacitor, Ceramic (MLCC), 220pF, ±10%, 50V, X7R, ±10%, SMD 0402; Manufacturer: Johanson Dielectrics; Manufacturer Part Number: 500R07W221KV4T; Package Size: 0402; JLCPCB Basic Part: No; JLCPCB Part Number: C431648; Supplier 1: LCSC; Category: Capacitors - MLCC; Supplier Part Number 1: C431648; Tolerance: ±10%; Voltage Rating: 50V; Temperature Coefficient: X7R; RoHS: Yes; ComponentLink1Description: Datasheet; ComponentLink1URL: https://wmsc.lcsc.com/wmsc/upload/file/pdf/v2/lcsc/2304140030_Johanson-Dielectrics-500R07W221KV4T_C431648.pdf; ComponentLink2Description: JLCPCB Part URL; ComponentLink2URL: https://jlcpcb.com/partdetail/C431648; ComponentLink3Description: LCSC Part URL; ComponentLink3URL: https://lcsc.com/product-detail/Multilayer-Ceramic-Capacitors-MLCC---SMD-SMT_Johanson-Dielectrics-Johanson-Dielectrics-500R07W221KV4T_C431648.html
footprint CAP-0402 (0402 (1005M) Capacitor)
pins: 1, 2

## 500R07W472KV4T
designator C?  Capacitance: 4.7nF  (hidden comment: *)
Capacitor, Ceramic (MLCC), 4.7nF, ±10%, 50V, X7R, ±10%, SMD 0402; Manufacturer: Johanson Dielectrics; Manufacturer Part Number: 500R07W472KV4T; Package Size: 0402; JLCPCB Basic Part: No; JLCPCB Part Number: C431649; Supplier 1: LCSC; Category: Capacitors - MLCC; Supplier Part Number 1: C431649; Tolerance: ±10%; Voltage Rating: 50V; Temperature Coefficient: X7R; RoHS: Yes; ComponentLink1Description: Datasheet; ComponentLink1URL: https://wmsc.lcsc.com/wmsc/upload/file/pdf/v2/lcsc/2304140030_Johanson-Dielectrics-500R07W472KV4T_C431649.pdf; ComponentLink2Description: JLCPCB Part URL; ComponentLink2URL: https://jlcpcb.com/partdetail/C431649; ComponentLink3Description: LCSC Part URL; ComponentLink3URL: https://lcsc.com/product-detail/Multilayer-Ceramic-Capacitors-MLCC---SMD-SMT_Johanson-Dielectrics-Johanson-Dielectrics-500R07W472KV4T_C431649.html
footprint CAP-0402 (0402 (1005M) Capacitor)
pins: 1, 2

## 04021J0R9PBSTR
designator C?  Capacitance: 0.9pF  (hidden comment: *)
Capacitor, Ceramic (MLCC), 0.9pF, 100V, SMD 0402; Manufacturer: AVX; Manufacturer Part Number: 04021J0R9PBSTR; Package Size: 0402; JLCPCB Basic Part: No; JLCPCB Part Number: C382059; Supplier 1: LCSC; Category: Capacitors - MLCC; Supplier Part Number 1: C382059; Voltage Rating: 100V; RoHS: Yes; ComponentLink1Description: Datasheet; ComponentLink1URL: https://wmsc.lcsc.com/wmsc/upload/file/pdf/v2/lcsc/1912111437_Kyocera-AVX-04021J0R9PBSTR_C382059.pdf; ComponentLink2Description: JLCPCB Part URL; ComponentLink2URL: https://jlcpcb.com/partdetail/C382059; ComponentLink3Description: LCSC Part URL; ComponentLink3URL: https://lcsc.com/product-detail/Multilayer-Ceramic-Capacitors-MLCC---SMD-SMT_Kyocera-AVX-Kyocera-AVX-04021J0R9PBSTR_C382059.html
footprint CAP-0402 (0402 (1005M) Capacitor)
pins: 1, 2

## 04023A101JAT2A
designator C?  Capacitance: 100pF  (hidden comment: *)
Capacitor, Ceramic (MLCC), 100pF, ±5%, 25V, C0G, ±5%, SMD 0402; Manufacturer: AVX; Manufacturer Part Number: 04023A101JAT2A; Package Size: 0402; JLCPCB Basic Part: No; JLCPCB Part Number: C597003; Supplier 1: LCSC; Category: Capacitors - MLCC; Supplier Part Number 1: C597003; Tolerance: ±5%; Voltage Rating: 25V; Temperature Coefficient: C0G; RoHS: Yes; ComponentLink1Description: Datasheet; ComponentLink1URL: https://wmsc.lcsc.com/wmsc/upload/file/pdf/v2/lcsc/2304140030_Kyocera-AVX-04023A101JAT2A_C597003.pdf; ComponentLink2Description: JLCPCB Part URL; ComponentLink2URL: https://jlcpcb.com/partdetail/C597003; ComponentLink3Description: LCSC Part URL; ComponentLink3URL: https://lcsc.com/product-detail/Multilayer-Ceramic-Capacitors-MLCC---SMD-SMT_Kyocera-AVX-Kyocera-AVX-04023A101JAT2A_C597003.html
footprint CAP-0402 (0402 (1005M) Capacitor)
pins: 1, 2

## 04023A220JAT2A
designator C?  Capacitance: 22pF  (hidden comment: *)
Capacitor, Ceramic (MLCC), 22pF, ±5%, 25V, C0G, ±5%, SMD 0402; Manufacturer: Kyocera AVX; Manufacturer Part Number: 04023A220JAT2A; Package Size: 0402; JLCPCB Basic Part: No; JLCPCB Part Number: C2168923; Supplier 1: LCSC; Category: Capacitors - MLCC; Supplier Part Number 1: C2168923; Tolerance: ±5%; Voltage Rating: 25V; Temperature Coefficient: C0G; RoHS: Yes; ComponentLink1Description: Datasheet; ComponentLink1URL: https://wmsc.lcsc.com/wmsc/upload/file/pdf/v2/lcsc/2304140030_Kyocera-AVX-04023A220JAT2A_C2168923.pdf; ComponentLink2Description: JLCPCB Part URL; ComponentLink2URL: https://jlcpcb.com/partdetail/C2168923; ComponentLink3Description: LCSC Part URL; ComponentLink3URL: https://lcsc.com/product-detail/Multilayer-Ceramic-Capacitors-MLCC---SMD-SMT_Kyocera-AVX-Kyocera-AVX-04023A220JAT2A_C2168923.html
footprint CAP-0402 (0402 (1005M) Capacitor)
pins: 1, 2

## 04023C101KAT2A
designator C?  Capacitance: 100pF  (hidden comment: *)
Capacitor, Ceramic (MLCC), 100pF, ±10%, 25V, X7R, ±10%, SMD 0402; Manufacturer: Kyocera AVX; Manufacturer Part Number: 04023C101KAT2A; Package Size: 0402; JLCPCB Basic Part: No; JLCPCB Part Number: C2168832; Supplier 1: LCSC; Category: Capacitors - MLCC; Supplier Part Number 1: C2168832; Tolerance: ±10%; Voltage Rating: 25V; Temperature Coefficient: X7R; RoHS: Yes; ComponentLink1Description: Datasheet; ComponentLink1URL: https://wmsc.lcsc.com/wmsc/upload/file/pdf/v2/lcsc/2304140030_Kyocera-AVX-04023C101KAT2A_C2168832.pdf; ComponentLink2Description: JLCPCB Part URL; ComponentLink2URL: https://jlcpcb.com/partdetail/C2168832; ComponentLink3Description: LCSC Part URL; ComponentLink3URL: https://lcsc.com/product-detail/Multilayer-Ceramic-Capacitors-MLCC---SMD-SMT_Kyocera-AVX-Kyocera-AVX-04023C101KAT2A_C2168832.html
footprint CAP-0402 (0402 (1005M) Capacitor)
pins: 1, 2

## 04023C104JAT2A
designator C?  Capacitance: 100nF  (hidden comment: *)
Capacitor, Ceramic (MLCC), 100nF, ±5%, 25V, X7R, ±5%, SMD 0402; Manufacturer: Kyocera AVX; Manufacturer Part Number: 04023C104JAT2A; Package Size: 0402; JLCPCB Basic Part: No; JLCPCB Part Number: C2169023; Supplier 1: LCSC; Category: Capacitors - MLCC; Supplier Part Number 1: C2169023; Tolerance: ±5%; Voltage Rating: 25V; Temperature Coefficient: X7R; RoHS: Yes; ComponentLink1Description: Datasheet; ComponentLink1URL: https://wmsc.lcsc.com/wmsc/upload/file/pdf/v2/lcsc/2304140030_Kyocera-AVX-04023C104JAT2A_C2169023.pdf; ComponentLink2Description: JLCPCB Part URL; ComponentLink2URL: https://jlcpcb.com/partdetail/C2169023; ComponentLink3Description: LCSC Part URL; ComponentLink3URL: https://lcsc.com/product-detail/Multilayer-Ceramic-Capacitors-MLCC---SMD-SMT_Kyocera-AVX-Kyocera-AVX-04023C104JAT2A_C2169023.html
footprint CAP-0402 (0402 (1005M) Capacitor)
pins: 1, 2

## 04023C562KAT2A
designator C?  Capacitance: 5.6nF  (hidden comment: *)
Capacitor, Ceramic (MLCC), 5.6nF, ±10%, 25V, X7R, ±10%, SMD 0402; Manufacturer: Kyocera AVX; Manufacturer Part Number: 04023C562KAT2A; Package Size: 0402; JLCPCB Basic Part: No; JLCPCB Part Number: C2168467; Supplier 1: LCSC; Category: Capacitors - MLCC; Supplier Part Number 1: C2168467; Tolerance: ±10%; Voltage Rating: 25V; Temperature Coefficient: X7R; RoHS: Yes; ComponentLink1Description: Datasheet; ComponentLink1URL: https://wmsc.lcsc.com/wmsc/upload/file/pdf/v2/lcsc/2304140030_Kyocera-AVX-04023C562KAT2A_C2168467.pdf; ComponentLink2Description: JLCPCB Part URL; ComponentLink2URL: https://jlcpcb.com/partdetail/C2168467; ComponentLink3Description: LCSC Part URL; ComponentLink3URL: https://lcsc.com/product-detail/Multilayer-Ceramic-Capacitors-MLCC---SMD-SMT_Kyocera-AVX-Kyocera-AVX-04023C562KAT2A_C2168467.html
footprint CAP-0402 (0402 (1005M) Capacitor)
pins: 1, 2

## 04023D103KAT2A
designator C?  Capacitance: 10nF  (hidden comment: *)
Capacitor, Ceramic (MLCC), 10nF, ±10%, 25V, X5R, ±10%, SMD 0402; Manufacturer: Kyocera AVX; Manufacturer Part Number: 04023D103KAT2A; Package Size: 0402; JLCPCB Basic Part: No; JLCPCB Part Number: C2167195; Supplier 1: LCSC; Category: Capacitors - MLCC; Supplier Part Number 1: C2167195; Tolerance: ±10%; Voltage Rating: 25V; Temperature Coefficient: X5R; RoHS: Yes; ComponentLink1Description: Datasheet; ComponentLink1URL: https://wmsc.lcsc.com/wmsc/upload/file/pdf/v2/lcsc/2304140030_Kyocera-AVX-04023D103KAT2A_C2167195.pdf; ComponentLink2Description: JLCPCB Part URL; ComponentLink2URL: https://jlcpcb.com/partdetail/C2167195; ComponentLink3Description: LCSC Part URL; ComponentLink3URL: https://lcsc.com/product-detail/Multilayer-Ceramic-Capacitors-MLCC---SMD-SMT_Kyocera-AVX-Kyocera-AVX-04023D103KAT2A_C2167195.html
footprint CAP-0402 (0402 (1005M) Capacitor)
pins: 1, 2

## 04024D225KAT2A
designator C?  Capacitance: 2.2uF  (hidden comment: *)
Capacitor, Ceramic (MLCC), 2.2uF, ±10%, 4V, X5R, ±10%, SMD 0402; Manufacturer: AVX; Manufacturer Part Number: 04024D225KAT2A; Package Size: 0402; JLCPCB Basic Part: No; JLCPCB Part Number: C350942; Supplier 1: LCSC; Category: Capacitors - MLCC; Supplier Part Number 1: C350942; Tolerance: ±10%; Voltage Rating: 4V; Temperature Coefficient: X5R; RoHS: Yes; ComponentLink1Description: Datasheet; ComponentLink1URL: https://wmsc.lcsc.com/wmsc/upload/file/pdf/v2/lcsc/1912111437_Kyocera-AVX-04024D225KAT2A_C350942.pdf; ComponentLink2Description: JLCPCB Part URL; ComponentLink2URL: https://jlcpcb.com/partdetail/C350942; ComponentLink3Description: LCSC Part URL; ComponentLink3URL: https://lcsc.com/product-detail/Multilayer-Ceramic-Capacitors-MLCC---SMD-SMT_Kyocera-AVX-Kyocera-AVX-04024D225KAT2A_C350942.html
footprint CAP-0402 (0402 (1005M) Capacitor)
pins: 1, 2

## 04025A1R0CAT2A
designator C?  Capacitance: 1pF  (hidden comment: *)
Capacitor, Ceramic (MLCC), 1pF, 50V, C0G, SMD 0402; Manufacturer: AVX; Manufacturer Part Number: 04025A1R0CAT2A; Package Size: 0402; JLCPCB Basic Part: No; JLCPCB Part Number: C167421; Supplier 1: LCSC; Category: Capacitors - MLCC; Supplier Part Number 1: C167421; Voltage Rating: 50V; Temperature Coefficient: C0G; RoHS: Yes; ComponentLink1Description: Datasheet; ComponentLink1URL: https://wmsc.lcsc.com/wmsc/upload/file/pdf/v2/lcsc/2304140030_Kyocera-AVX-04025A1R0CAT2A_C167421.pdf; ComponentLink2Description: JLCPCB Part URL; ComponentLink2URL: https://jlcpcb.com/partdetail/C167421; ComponentLink3Description: LCSC Part URL; ComponentLink3URL: https://lcsc.com/product-detail/Multilayer-Ceramic-Capacitors-MLCC---SMD-SMT_Kyocera-AVX-Kyocera-AVX-04025A1R0CAT2A_C167421.html
footprint CAP-0402 (0402 (1005M) Capacitor)
pins: 1, 2

## 04025A4R7CAT2A
designator C?  Capacitance: 4.7pF  (hidden comment: *)
Capacitor, Ceramic (MLCC), 4.7pF, 50V, C0G, SMD 0402; Manufacturer: AVX; Manufacturer Part Number: 04025A4R7CAT2A; Package Size: 0402; JLCPCB Basic Part: No; JLCPCB Part Number: C167420; Supplier 1: LCSC; Category: Capacitors - MLCC; Supplier Part Number 1: C167420; Voltage Rating: 50V; Temperature Coefficient: C0G; RoHS: Yes; ComponentLink1Description: Datasheet; ComponentLink1URL: https://wmsc.lcsc.com/wmsc/upload/file/pdf/v2/lcsc/2304140030_Kyocera-AVX-04025A4R7CAT2A_C167420.pdf; ComponentLink2Description: JLCPCB Part URL; ComponentLink2URL: https://jlcpcb.com/partdetail/C167420; ComponentLink3Description: LCSC Part URL; ComponentLink3URL: https://lcsc.com/product-detail/Multilayer-Ceramic-Capacitors-MLCC---SMD-SMT_Kyocera-AVX-Kyocera-AVX-04025A4R7CAT2A_C167420.html
footprint CAP-0402 (0402 (1005M) Capacitor)
pins: 1, 2

## 04025A6R8CAT2A
designator C?  Capacitance: 6.8pF  (hidden comment: *)
Capacitor, Ceramic (MLCC), 6.8pF, 50V, C0G, SMD 0402; Manufacturer: AVX; Manufacturer Part Number: 04025A6R8CAT2A; Package Size: 0402; JLCPCB Basic Part: No; JLCPCB Part Number: C597037; Supplier 1: LCSC; Category: Capacitors - MLCC; Supplier Part Number 1: C597037; Voltage Rating: 50V; Temperature Coefficient: C0G; RoHS: Yes; ComponentLink1Description: Datasheet; ComponentLink1URL: https://wmsc.lcsc.com/wmsc/upload/file/pdf/v2/lcsc/2304140030_Kyocera-AVX-04025A6R8CAT2A_C597037.pdf; ComponentLink2Description: JLCPCB Part URL; ComponentLink2URL: https://jlcpcb.com/partdetail/C597037; ComponentLink3Description: LCSC Part URL; ComponentLink3URL: https://lcsc.com/product-detail/Multilayer-Ceramic-Capacitors-MLCC---SMD-SMT_Kyocera-AVX-Kyocera-AVX-04025A6R8CAT2A_C597037.html
footprint CAP-0402 (0402 (1005M) Capacitor)
pins: 1, 2
